# Altium integrated library 860010580021_Altium_WCAP-ATG8_rev20a.IntLib: 195 symbols (part 1 of 2) (continued)
## 860010378023
designator C?, comment 3300uF, 16V
WCAP-ATG8 Aluminum Electrolytic Capacitor, Radial, THT, D13xH20mm, 3300uF, 16V; Manufacturer Part Number: 860010378023; Manufacturer: Wurth Elektronik; Dissipation Factor: 16%; Endurance: 2000h; Leakage Current: 528uA; Ripple Current: 1750mA; Capacitance Tolerance: +/-20%; Rated Voltage: 16VDC; Technical Reference: ATBI200332M016DSPACB000; ComponentLink1Description: Manufacturer; ComponentLink1URL: http://www.we-online.de; ComponentLink2Description: Datasheet; ComponentLink2URL: https://www.we-online.com/catalog/datasheet/860010378023.pdf; Height: 20mm; Mounting Technology: THT; Operating Temperature: -40 to +85degC; Packaging: Ammo Pack; Published Date: May 2020; Capacitance: 3300uF; Diameter: 13mm
footprint WCAP-ATG8_13x20
pins: 1 N, 2 P

## 860010380024
designator C?, comment 3900uF, 16V
WCAP-ATG8 Aluminum Electrolytic Capacitor, Radial, THT, D16xH25mm, 3900uF, 16V; Manufacturer Part Number: 860010380024; Manufacturer: Wurth Elektronik; Dissipation Factor: 16%; Endurance: 2000h; Leakage Current: 624uA; Ripple Current: 2002mA; Capacitance Tolerance: +/-20%; Rated Voltage: 16VDC; Technical Reference: ATBK250392M016DSPAEB000; ComponentLink1Description: Manufacturer; ComponentLink1URL: http://www.we-online.de; ComponentLink2Description: Datasheet; ComponentLink2URL: https://www.we-online.com/catalog/datasheet/860010380024.pdf; Height: 25mm; Mounting Technology: THT; Operating Temperature: -40 to +85degC; Packaging: Ammo Pack; Published Date: May 2020; Capacitance: 3900uF; Diameter: 16mm
footprint WCAP-ATG8_16x25
pins: 1 N, 2 P

## 860010380025
designator C?, comment 4700uF, 16V
WCAP-ATG8 Aluminum Electrolytic Capacitor, Radial, THT, D16xH25mm, 4700uF, 16V; Manufacturer Part Number: 860010380025; Manufacturer: Wurth Elektronik; Dissipation Factor: 16%; Endurance: 2000h; Leakage Current: 752uA; Ripple Current: 2310mA; Capacitance Tolerance: +/-20%; Rated Voltage: 16VDC; Technical Reference: ATBK250472M016DSPAEB000; ComponentLink1Description: Manufacturer; ComponentLink1URL: http://www.we-online.de; ComponentLink2Description: Datasheet; ComponentLink2URL: https://www.we-online.com/catalog/datasheet/860010380025.pdf; Height: 25mm; Mounting Technology: THT; Operating Temperature: -40 to +85degC; Packaging: Ammo Pack; Published Date: May 2020; Capacitance: 4700uF; Diameter: 16mm
footprint WCAP-ATG8_16x25
pins: 1 N, 2 P

## 860010380026
designator C?, comment 5600uF, 16V
WCAP-ATG8 Aluminum Electrolytic Capacitor, Radial, THT, D16xH31.5mm, 5600uF, 16V; Manufacturer Part Number: 860010380026; Manufacturer: Wurth Elektronik; Dissipation Factor: 16%; Endurance: 2000h; Leakage Current: 896uA; Ripple Current: 2453mA; Capacitance Tolerance: +/-20%; Rated Voltage: 16VDC; Technical Reference: ATBK315562M016DSPADB000; ComponentLink1Description: Manufacturer; ComponentLink1URL: http://www.we-online.de; ComponentLink2Description: Datasheet; ComponentLink2URL: https://www.we-online.com/catalog/datasheet/860010380026.pdf; Height: 31.5mm; Mounting Technology: THT; Operating Temperature: -40 to +85degC; Packaging: Ammo Pack; Published Date: May 2020; Capacitance: 5600uF; Diameter: 16mm
footprint WCAP-ATG8_16x31.5
pins: 1 N, 2 P

## 860010380027
designator C?, comment 6800uF, 16V
WCAP-ATG8 Aluminum Electrolytic Capacitor, Radial, THT, D16xH31.5mm, 6800uF, 16V; Manufacturer Part Number: 860010380027; Manufacturer: Wurth Elektronik; Dissipation Factor: 16%; Endurance: 2000h; Leakage Current: 1088uA; Ripple Current: 2805mA; Capacitance Tolerance: +/-20%; Rated Voltage: 16VDC; Technical Reference: ATBK315682M016DSPADB000; ComponentLink1Description: Manufacturer; ComponentLink1URL: http://www.we-online.de; ComponentLink2Description: Datasheet; ComponentLink2URL: https://www.we-online.com/catalog/datasheet/860010380027.pdf; Height: 31.5mm; Mounting Technology: THT; Operating Temperature: -40 to +85degC; Packaging: Ammo Pack; Published Date: May 2020; Capacitance: 6800uF; Diameter: 16mm
footprint WCAP-ATG8_16x31.5
pins: 1 N, 2 P

## 860010380028
designator C?, comment 8200uF, 16V
WCAP-ATG8 Aluminum Electrolytic Capacitor, Radial, THT, D16xH35.5mm, 8200uF, 16V; Manufacturer Part Number: 860010380028; Manufacturer: Wurth Elektronik; Dissipation Factor: 16%; Endurance: 2000h; Leakage Current: 1312uA; Ripple Current: 2893mA; Capacitance Tolerance: +/-20%; Rated Voltage: 16VDC; Technical Reference: ATBK355822M016DSPADB000; ComponentLink1Description: Manufacturer; ComponentLink1URL: http://www.we-online.de; ComponentLink2Description: Datasheet; ComponentLink2URL: https://www.we-online.com/catalog/datasheet/860010380028.pdf; Height: 35.5mm; Mounting Technology: THT; Operating Temperature: -40 to +85degC; Packaging: Ammo Pack; Published Date: May 2020; Capacitance: 8200uF; Diameter: 16mm
footprint WCAP-ATG8_16x35.5
pins: 1 N, 2 P

## 860010381029
designator C?, comment 10000uF, 16V
WCAP-ATG8 Aluminum Electrolytic Capacitor, Radial, THT, D18xH35.5mm, 10000uF, 16V; Manufacturer Part Number: 860010381029; Manufacturer: Wurth Elektronik; Dissipation Factor: 16%; Endurance: 2000h; Leakage Current: 1600uA; Ripple Current: 2970mA; Capacitance Tolerance: +/-20%; Rated Voltage: 16VDC; Technical Reference: ATBL355103M016DSPAEB000; ComponentLink1Description: Manufacturer; ComponentLink1URL: http://www.we-online.de; ComponentLink2Description: Datasheet; ComponentLink2URL: https://www.we-online.com/catalog/datasheet/860010381029.pdf; Height: 35.5mm; Mounting Technology: THT; Operating Temperature: -40 to +85degC; Packaging: Ammo Pack; Published Date: May 2020; Capacitance: 10000uF; Diameter: 18mm
footprint WCAP-ATG8_18x35.5
pins: 1 N, 2 P

## 860010381030
designator C?, comment 12000uF, 16V
WCAP-ATG8 Aluminum Electrolytic Capacitor, Radial, THT, D18xH35.5mm, 12000uF, 16V; Manufacturer Part Number: 860010381030; Manufacturer: Wurth Elektronik; Dissipation Factor: 16%; Endurance: 2000h; Leakage Current: 1920uA; Ripple Current: 3058mA; Capacitance Tolerance: +/-20%; Rated Voltage: 16VDC; Technical Reference: ATBL355123M016DSPAEB000; ComponentLink1Description: Manufacturer; ComponentLink1URL: http://www.we-online.de; ComponentLink2Description: Datasheet; ComponentLink2URL: https://www.we-online.com/catalog/datasheet/860010381030.pdf; Height: 35.5mm; Mounting Technology: THT; Operating Temperature: -40 to +85degC; Packaging: Ammo Pack; Published Date: May 2020; Capacitance: 12000uF; Diameter: 18mm
footprint WCAP-ATG8_18x35.5
pins: 1 N, 2 P

## 860010383031
designator C?, comment 15000uF, 16V
WCAP-ATG8 Aluminum Electrolytic Capacitor, Radial, THT, D22xH41mm, 15000uF, 16V; Manufacturer Part Number: 860010383031; Manufacturer: Wurth Elektronik; Dissipation Factor: 16%; Endurance: 2000h; Leakage Current: 2400uA; Ripple Current: 3905mA; Capacitance Tolerance: +/-20%; Rated Voltage: 16VDC; Technical Reference: ATBN410153M016DSPS2B000; ComponentLink1Description: Manufacturer; ComponentLink1URL: http://www.we-online.de; ComponentLink2Description: Datasheet; ComponentLink2URL: https://www.we-online.com/catalog/datasheet/860010383031.pdf; Height: 41mm; Mounting Technology: THT; Operating Temperature: -40 to +85degC; Packaging: Ammo Pack; Published Date: May 2020; Capacitance: 15000uF; Diameter: 22mm
footprint WCAP-ATG8_22x41
pins: 1 N, 2 P

## 860010472001
designator C?, comment 4.7uF, 25V
WCAP-ATG8 Aluminum Electrolytic Capacitor, Radial, THT, D5xH11mm, 4.7uF, 25V; Manufacturer Part Number: 860010472001; Manufacturer: Wurth Elektronik; Dissipation Factor: 14%; Endurance: 2000h; Leakage Current: 3uA; Ripple Current: 34mA; Capacitance Tolerance: +/-20%; Rated Voltage: 25VDC; Technical Reference: ATBC1104R7M025DSPA3B000; ComponentLink1Description: Manufacturer; ComponentLink1URL: http://www.we-online.de; ComponentLink2Description: Datasheet; ComponentLink2URL: https://www.we-online.com/catalog/datasheet/860010472001.pdf; Height: 11mm; Mounting Technology: THT; Operating Temperature: -40 to +85degC; Packaging: Ammo Pack; Published Date: May 2020; Capacitance: 4.7uF; Diameter: 5mm
footprint WCAP-ATG8_5x11
pins: 1 N, 2 P

## 860010472002
designator C?, comment 10uF, 25V
WCAP-ATG8 Aluminum Electrolytic Capacitor, Radial, THT, D5xH11mm, 10uF, 25V; Manufacturer Part Number: 860010472002; Manufacturer: Wurth Elektronik; Dissipation Factor: 14%; Endurance: 2000h; Leakage Current: 3uA; Ripple Current: 50mA; Capacitance Tolerance: +/-20%; Rated Voltage: 25VDC; Technical Reference: ATBC110100M025DSPA3B000; ComponentLink1Description: Manufacturer; ComponentLink1URL: http://www.we-online.de; ComponentLink2Description: Datasheet; ComponentLink2URL: https://www.we-online.com/catalog/datasheet/860010472002.pdf; Height: 11mm; Mounting Technology: THT; Operating Temperature: -40 to +85degC; Packaging: Ammo Pack; Published Date: May 2020; Capacitance: 10uF; Diameter: 5mm
footprint WCAP-ATG8_5x11
pins: 1 N, 2 P

## 860010472003
designator C?, comment 22uF, 25V
WCAP-ATG8 Aluminum Electrolytic Capacitor, Radial, THT, D5xH11mm, 22uF, 25V; Manufacturer Part Number: 860010472003; Manufacturer: Wurth Elektronik; Dissipation Factor: 14%; Endurance: 2000h; Leakage Current: 5.5uA; Ripple Current: 94mA; Capacitance Tolerance: +/-20%; Rated Voltage: 25VDC; Technical Reference: ATBC110220M025DSPA3B000; ComponentLink1Description: Manufacturer; ComponentLink1URL: http://www.we-online.de; ComponentLink2Description: Datasheet; ComponentLink2URL: https://www.we-online.com/catalog/datasheet/860010472003.pdf; Height: 11mm; Mounting Technology: THT; Operating Temperature: -40 to +85degC; Packaging: Ammo Pack; Published Date: May 2020; Capacitance: 22uF; Diameter: 5mm
footprint WCAP-ATG8_5x11
pins: 1 N, 2 P

## 860010472004
designator C?, comment 33uF, 25V
WCAP-ATG8 Aluminum Electrolytic Capacitor, Radial, THT, D5xH11mm, 33uF, 25V; Manufacturer Part Number: 860010472004; Manufacturer: Wurth Elektronik; Dissipation Factor: 14%; Endurance: 2000h; Leakage Current: 8.25uA; Ripple Current: 105mA; Capacitance Tolerance: +/-20%; Rated Voltage: 25VDC; Technical Reference: ATBC110330M025DSPA3B000; ComponentLink1Description: Manufacturer; ComponentLink1URL: http://www.we-online.de; ComponentLink2Description: Datasheet; ComponentLink2URL: https://www.we-online.com/catalog/datasheet/860010472004.pdf; Height: 11mm; Mounting Technology: THT; Operating Temperature: -40 to +85degC; Packaging: Ammo Pack; Published Date: May 2020; Capacitance: 33uF; Diameter: 5mm
footprint WCAP-ATG8_5x11
pins: 1 N, 2 P

## 860010472005
designator C?, comment 47uF, 25V
WCAP-ATG8 Aluminum Electrolytic Capacitor, Radial, THT, D5xH11mm, 47uF, 25V; Manufacturer Part Number: 860010472005; Manufacturer: Wurth Elektronik; Dissipation Factor: 14%; Endurance: 2000h; Leakage Current: 11.75uA; Ripple Current: 132mA; Capacitance Tolerance: +/-20%; Rated Voltage: 25VDC; Technical Reference: ATBC110470M025DSPA3B000; ComponentLink1Description: Manufacturer; ComponentLink1URL: http://www.we-online.de; ComponentLink2Description: Datasheet; ComponentLink2URL: https://www.we-online.com/catalog/datasheet/860010472005.pdf; Height: 11mm; Mounting Technology: THT; Operating Temperature: -40 to +85degC; Packaging: Ammo Pack; Published Date: May 2020; Capacitance: 47uF; Diameter: 5mm
footprint WCAP-ATG8_5x11
pins: 1 N, 2 P

## 860010473006
designator C?, comment 68uF, 25V
WCAP-ATG8 Aluminum Electrolytic Capacitor, Radial, THT, D6.3xH11mm, 68uF, 25V; Manufacturer Part Number: 860010473006; Manufacturer: Wurth Elektronik; Dissipation Factor: 14%; Endurance: 2000h; Leakage Current: 17uA; Ripple Current: 176mA; Capacitance Tolerance: +/-20%; Rated Voltage: 25VDC; Technical Reference: ATBD110680M025DSPA4B000; ComponentLink1Description: Manufacturer; ComponentLink1URL: http://www.we-online.de; ComponentLink2Description: Datasheet; ComponentLink2URL: https://www.we-online.com/catalog/datasheet/860010473006.pdf; Height: 11mm; Mounting Technology: THT; Operating Temperature: -40 to +85degC; Packaging: Ammo Pack; Published Date: May 2020; Capacitance: 68uF; Diameter: 6.3mm
footprint WCAP-ATG8_6.3x11
pins: 1 N, 2 P

## 860010473007
designator C?, comment 100uF, 25V
WCAP-ATG8 Aluminum Electrolytic Capacitor, Radial, THT, D6.3xH11mm, 100uF, 25V; Manufacturer Part Number: 860010473007; Manufacturer: Wurth Elektronik; Dissipation Factor: 14%; Endurance: 2000h; Leakage Current: 25uA; Ripple Current: 209mA; Capacitance Tolerance: +/-20%; Rated Voltage: 25VDC; Technical Reference: ATBD110101M025DSPA4B000; ComponentLink1Description: Manufacturer; ComponentLink1URL: http://www.we-online.de; ComponentLink2Description: Datasheet; ComponentLink2URL: https://www.we-online.com/catalog/datasheet/860010473007.pdf; Height: 11mm; Mounting Technology: THT; Operating Temperature: -40 to +85degC; Packaging: Ammo Pack; Published Date: May 2020; Capacitance: 100uF; Diameter: 6.3mm
footprint WCAP-ATG8_6.3x11
pins: 1 N, 2 P

## 860010473008
designator C?, comment 120uF, 25V
WCAP-ATG8 Aluminum Electrolytic Capacitor, Radial, THT, D6.3xH11mm, 120uF, 25V; Manufacturer Part Number: 860010473008; Manufacturer: Wurth Elektronik; Dissipation Factor: 14%; Endurance: 2000h; Leakage Current: 30uA; Ripple Current: 253mA; Capacitance Tolerance: +/-20%; Rated Voltage: 25VDC; Technical Reference: ATBD110121M025DSPA4B000; ComponentLink1Description: Manufacturer; ComponentLink1URL: http://www.we-online.de; ComponentLink2Description: Datasheet; ComponentLink2URL: https://www.we-online.com/catalog/datasheet/860010473008.pdf; Height: 11mm; Mounting Technology: THT; Operating Temperature: -40 to +85degC; Packaging: Ammo Pack; Published Date: May 2020; Capacitance: 120uF; Diameter: 6.3mm
footprint WCAP-ATG8_6.3x11
pins: 1 N, 2 P

## 860010473009
designator C?, comment 150uF, 25V
WCAP-ATG8 Aluminum Electrolytic Capacitor, Radial, THT, D6.3xH11mm, 150uF, 25V; Manufacturer Part Number: 860010473009; Manufacturer: Wurth Elektronik; Dissipation Factor: 14%; Endurance: 2000h; Leakage Current: 37.5uA; Ripple Current: 275mA; Capacitance Tolerance: +/-20%; Rated Voltage: 25VDC; Technical Reference: ATBD110151M025DSPA4B000; ComponentLink1Description: Manufacturer; ComponentLink1URL: http://www.we-online.de; ComponentLink2Description: Datasheet; ComponentLink2URL: https://www.we-online.com/catalog/datasheet/860010473009.pdf; Height: 11mm; Mounting Technology: THT; Operating Temperature: -40 to +85degC; Packaging: Ammo Pack; Published Date: May 2020; Capacitance: 150uF; Diameter: 6.3mm
footprint WCAP-ATG8_6.3x11
pins: 1 N, 2 P

## 860010473010
designator C?, comment 180uF, 25V
WCAP-ATG8 Aluminum Electrolytic Capacitor, Radial, THT, D6.3xH11mm, 180uF, 25V; Manufacturer Part Number: 860010473010; Manufacturer: Wurth Elektronik; Dissipation Factor: 14%; Endurance: 2000h; Leakage Current: 45uA; Ripple Current: 280mA; Capacitance Tolerance: +/-20%; Rated Voltage: 25VDC; Technical Reference: ATBD110181M025DSPA4B000; ComponentLink1Description: Manufacturer; ComponentLink1URL: http://www.we-online.de; ComponentLink2Description: Datasheet; ComponentLink2URL: https://www.we-online.com/catalog/datasheet/860010473010.pdf; Height: 11mm; Mounting Technology: THT; Operating Temperature: -40 to +85degC; Packaging: Ammo Pack; Published Date: May 2020; Capacitance: 180uF; Diameter: 6.3mm
footprint WCAP-ATG8_6.3x11
pins: 1 N, 2 P

## 860010473011
designator C?, comment 220uF, 25V
WCAP-ATG8 Aluminum Electrolytic Capacitor, Radial, THT, D6.3xH11mm, 220uF, 25V; Manufacturer Part Number: 860010473011; Manufacturer: Wurth Elektronik; Dissipation Factor: 14%; Endurance: 2000h; Leakage Current: 55uA; Ripple Current: 310mA; Capacitance Tolerance: +/-20%; Rated Voltage: 25VDC; Technical Reference: ATBD110221M025DSPA4B000; ComponentLink1Description: Manufacturer; ComponentLink1URL: http://www.we-online.de; ComponentLink2Description: Datasheet; ComponentLink2URL: https://www.we-online.com/catalog/datasheet/860010473011.pdf; Height: 11mm; Mounting Technology: THT; Operating Temperature: -40 to +85degC; Packaging: Ammo Pack; Published Date: May 2020; Capacitance: 220uF; Diameter: 6.3mm
footprint WCAP-ATG8_6.3x11
pins: 1 N, 2 P

## 860010474012
designator C?, comment 330uF, 25V
WCAP-ATG8 Aluminum Electrolytic Capacitor, Radial, THT, D8xH11.5mm, 330uF, 25V; Manufacturer Part Number: 860010474012; Manufacturer: Wurth Elektronik; Dissipation Factor: 14%; Endurance: 2000h; Leakage Current: 82.5uA; Ripple Current: 451mA; Capacitance Tolerance: +/-20%; Rated Voltage: 25VDC; Technical Reference: ATBE115331M025DSPA7B000; ComponentLink1Description: Manufacturer; ComponentLink1URL: http://www.we-online.de; ComponentLink2Description: Datasheet; ComponentLink2URL: https://www.we-online.com/catalog/datasheet/860010474012.pdf; Height: 11.5mm; Mounting Technology: THT; Operating Temperature: -40 to +85degC; Packaging: Ammo Pack; Published Date: May 2020; Capacitance: 330uF; Diameter: 8mm
footprint WCAP-ATG8_8x11.5
pins: 1 N, 2 P

## 860010474013
designator C?, comment 470uF, 25V
WCAP-ATG8 Aluminum Electrolytic Capacitor, Radial, THT, D8xH11.5mm, 470uF, 25V; Manufacturer Part Number: 860010474013; Manufacturer: Wurth Elektronik; Dissipation Factor: 14%; Endurance: 2000h; Leakage Current: 117.5uA; Ripple Current: 561mA; Capacitance Tolerance: +/-20%; Rated Voltage: 25VDC; Technical Reference: ATBE115471M025DSPA7B000; ComponentLink1Description: Manufacturer; ComponentLink1URL: http://www.we-online.de; ComponentLink2Description: Datasheet; ComponentLink2URL: https://www.we-online.com/catalog/datasheet/860010474013.pdf; Height: 11.5mm; Mounting Technology: THT; Operating Temperature: -40 to +85degC; Packaging: Ammo Pack; Published Date: May 2020; Capacitance: 470uF; Diameter: 8mm
footprint WCAP-ATG8_8x11.5
pins: 1 N, 2 P

## 860010475014
designator C?, comment 560uF, 25V
WCAP-ATG8 Aluminum Electrolytic Capacitor, Radial, THT, D10xH16mm, 560uF, 25V; Manufacturer Part Number: 860010475014; Manufacturer: Wurth Elektronik; Dissipation Factor: 14%; Endurance: 2000h; Leakage Current: 140uA; Ripple Current: 693mA; Capacitance Tolerance: +/-20%; Rated Voltage: 25VDC; Technical Reference: ATBF160561M025DSPAAB000; ComponentLink1Description: Manufacturer; ComponentLink1URL: http://www.we-online.de; ComponentLink2Description: Datasheet; ComponentLink2URL: https://www.we-online.com/catalog/datasheet/860010475014.pdf; Height: 16mm; Mounting Technology: THT; Operating Temperature: -40 to +85degC; Packaging: Ammo Pack; Published Date: May 2020; Capacitance: 560uF; Diameter: 10mm
footprint WCAP-ATG8_10x16
pins: 1 N, 2 P

## 860010475015
designator C?, comment 680uF, 25V
WCAP-ATG8 Aluminum Electrolytic Capacitor, Radial, THT, D10xH16mm, 680uF, 25V; Manufacturer Part Number: 860010475015; Manufacturer: Wurth Elektronik; Dissipation Factor: 14%; Endurance: 2000h; Leakage Current: 170uA; Ripple Current: 792mA; Capacitance Tolerance: +/-20%; Rated Voltage: 25VDC; Technical Reference: ATBF160681M025DSPAAB000; ComponentLink1Description: Manufacturer; ComponentLink1URL: http://www.we-online.de; ComponentLink2Description: Datasheet; ComponentLink2URL: https://www.we-online.com/catalog/datasheet/860010475015.pdf; Height: 16mm; Mounting Technology: THT; Operating Temperature: -40 to +85degC; Packaging: Ammo Pack; Published Date: May 2020; Capacitance: 680uF; Diameter: 10mm
footprint WCAP-ATG8_10x16
pins: 1 N, 2 P

## 860010475016
designator C?, comment 820uF, 25V
WCAP-ATG8 Aluminum Electrolytic Capacitor, Radial, THT, D10xH20mm, 820uF, 25V; Manufacturer Part Number: 860010475016; Manufacturer: Wurth Elektronik; Dissipation Factor: 14%; Endurance: 2000h; Leakage Current: 205uA; Ripple Current: 891mA; Capacitance Tolerance: +/-20%; Rated Voltage: 25VDC; Technical Reference: ATBF200821M025DSPAAB000; ComponentLink1Description: Manufacturer; ComponentLink1URL: http://www.we-online.de; ComponentLink2Description: Datasheet; ComponentLink2URL: https://www.we-online.com/catalog/datasheet/860010475016.pdf; Height: 20mm; Mounting Technology: THT; Operating Temperature: -40 to +85degC; Packaging: Ammo Pack; Published Date: May 2020; Capacitance: 820uF; Diameter: 10mm
footprint WCAP-ATG8_10x20
pins: 1 N, 2 P

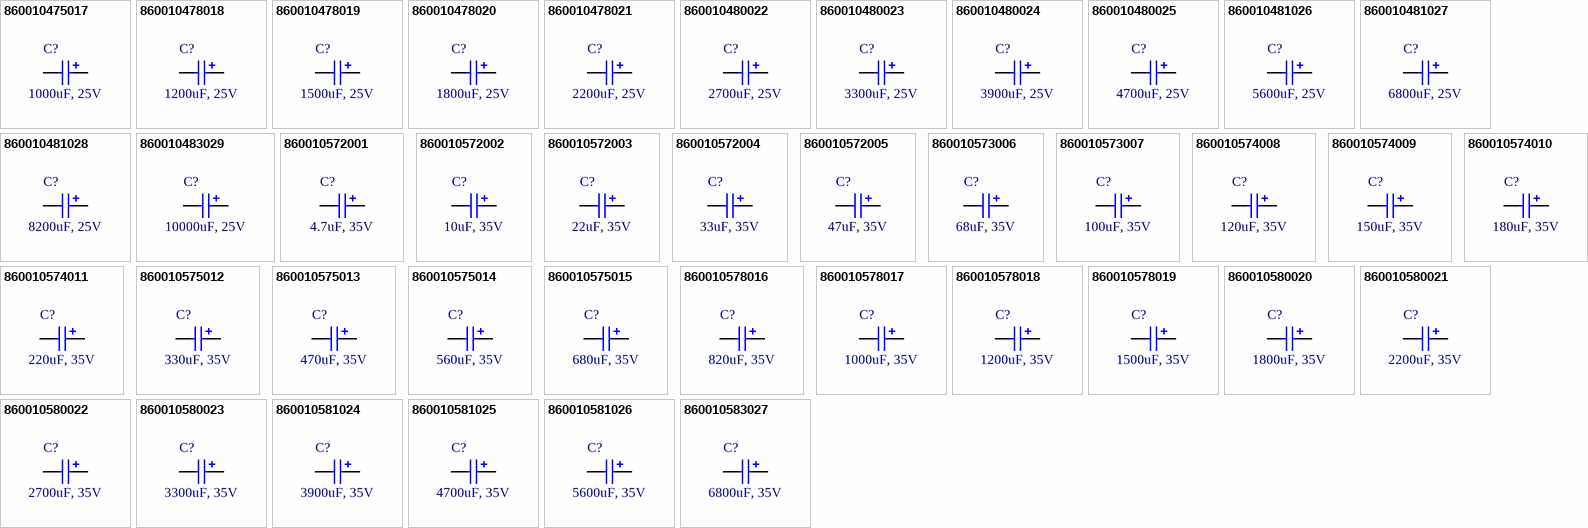
[diagram p2: symbols 860010475017 to 860010583027]

## 860010475017
designator C?, comment 1000uF, 25V
WCAP-ATG8 Aluminum Electrolytic Capacitor, Radial, THT, D10xH20mm, 1000uF, 25V; Manufacturer Part Number: 860010475017; Manufacturer: Wurth Elektronik; Dissipation Factor: 14%; Endurance: 2000h; Leakage Current: 250uA; Ripple Current: 1050mA; Capacitance Tolerance: +/-20%; Rated Voltage: 25VDC; Technical Reference: ATBF200102M025DSPAAB000; ComponentLink1Description: Manufacturer; ComponentLink1URL: http://www.we-online.de; ComponentLink2Description: Datasheet; ComponentLink2URL: https://www.we-online.com/catalog/datasheet/860010475017.pdf; Height: 20mm; Mounting Technology: THT; Operating Temperature: -40 to +85degC; Packaging: Ammo Pack; Published Date: May 2020; Capacitance: 1000uF; Diameter: 10mm
footprint WCAP-ATG8_10x20
pins: 1 N, 2 P

## 860010478018
designator C?, comment 1200uF, 25V
WCAP-ATG8 Aluminum Electrolytic Capacitor, Radial, THT, D13xH20mm, 1200uF, 25V; Manufacturer Part Number: 860010478018; Manufacturer: Wurth Elektronik; Dissipation Factor: 14%; Endurance: 2000h; Leakage Current: 300uA; Ripple Current: 1155mA; Capacitance Tolerance: +/-20%; Rated Voltage: 25VDC; Technical Reference: ATBI200122M025DSPACB000; ComponentLink1Description: Manufacturer; ComponentLink1URL: http://www.we-online.de; ComponentLink2Description: Datasheet; ComponentLink2URL: https://www.we-online.com/catalog/datasheet/860010478018.pdf; Height: 20mm; Mounting Technology: THT; Operating Temperature: -40 to +85degC; Packaging: Ammo Pack; Published Date: May 2020; Capacitance: 1200uF; Diameter: 13mm
footprint WCAP-ATG8_13x20
pins: 1 N, 2 P

## 860010478019
designator C?, comment 1500uF, 25V
WCAP-ATG8 Aluminum Electrolytic Capacitor, Radial, THT, D13xH20mm, 1500uF, 25V; Manufacturer Part Number: 860010478019; Manufacturer: Wurth Elektronik; Dissipation Factor: 14%; Endurance: 2000h; Leakage Current: 375uA; Ripple Current: 1353mA; Capacitance Tolerance: +/-20%; Rated Voltage: 25VDC; Technical Reference: ATBI200152M025DSPACB000; ComponentLink1Description: Manufacturer; ComponentLink1URL: http://www.we-online.de; ComponentLink2Description: Datasheet; ComponentLink2URL: https://www.we-online.com/catalog/datasheet/860010478019.pdf; Height: 20mm; Mounting Technology: THT; Operating Temperature: -40 to +85degC; Packaging: Ammo Pack; Published Date: May 2020; Capacitance: 1500uF; Diameter: 13mm
footprint WCAP-ATG8_13x20
pins: 1 N, 2 P

## 860010478020
designator C?, comment 1800uF, 25V
WCAP-ATG8 Aluminum Electrolytic Capacitor, Radial, THT, D13xH20mm, 1800uF, 25V; Manufacturer Part Number: 860010478020; Manufacturer: Wurth Elektronik; Dissipation Factor: 14%; Endurance: 2000h; Leakage Current: 450uA; Ripple Current: 1496mA; Capacitance Tolerance: +/-20%; Rated Voltage: 25VDC; Technical Reference: ATBI200182M025DSPACB000; ComponentLink1Description: Manufacturer; ComponentLink1URL: http://www.we-online.de; ComponentLink2Description: Datasheet; ComponentLink2URL: https://www.we-online.com/catalog/datasheet/860010478020.pdf; Height: 20mm; Mounting Technology: THT; Operating Temperature: -40 to +85degC; Packaging: Ammo Pack; Published Date: May 2020; Capacitance: 1800uF; Diameter: 13mm
footprint WCAP-ATG8_13x20
pins: 1 N, 2 P

## 860010478021
designator C?, comment 2200uF, 25V
WCAP-ATG8 Aluminum Electrolytic Capacitor, Radial, THT, D13xH25mm, 2200uF, 25V; Manufacturer Part Number: 860010478021; Manufacturer: Wurth Elektronik; Dissipation Factor: 14%; Endurance: 2000h; Leakage Current: 550uA; Ripple Current: 1705mA; Capacitance Tolerance: +/-20%; Rated Voltage: 25VDC; Technical Reference: ATBI250222M025DSPACB000; ComponentLink1Description: Manufacturer; ComponentLink1URL: http://www.we-online.de; ComponentLink2Description: Datasheet; ComponentLink2URL: https://www.we-online.com/catalog/datasheet/860010478021.pdf; Height: 25mm; Mounting Technology: THT; Operating Temperature: -40 to +85degC; Packaging: Ammo Pack; Published Date: May 2020; Capacitance: 2200uF; Diameter: 13mm
footprint WCAP-ATG8_13x25
pins: 1 N, 2 P

## 860010480022
designator C?, comment 2700uF, 25V
WCAP-ATG8 Aluminum Electrolytic Capacitor, Radial, THT, D16xH25mm, 2700uF, 25V; Manufacturer Part Number: 860010480022; Manufacturer: Wurth Elektronik; Dissipation Factor: 14%; Endurance: 2000h; Leakage Current: 675uA; Ripple Current: 1804mA; Capacitance Tolerance: +/-20%; Rated Voltage: 25VDC; Technical Reference: ATBK250272M025DSPAEB000; ComponentLink1Description: Manufacturer; ComponentLink1URL: http://www.we-online.de; ComponentLink2Description: Datasheet; ComponentLink2URL: https://www.we-online.com/catalog/datasheet/860010480022.pdf; Height: 25mm; Mounting Technology: THT; Operating Temperature: -40 to +85degC; Packaging: Ammo Pack; Published Date: May 2020; Capacitance: 2700uF; Diameter: 16mm
footprint WCAP-ATG8_16x25
pins: 1 N, 2 P

## 860010480023
designator C?, comment 3300uF, 25V
WCAP-ATG8 Aluminum Electrolytic Capacitor, Radial, THT, D16xH25mm, 3300uF, 25V; Manufacturer Part Number: 860010480023; Manufacturer: Wurth Elektronik; Dissipation Factor: 14%; Endurance: 2000h; Leakage Current: 825uA; Ripple Current: 1870mA; Capacitance Tolerance: +/-20%; Rated Voltage: 25VDC; Technical Reference: ATBK250332M025DSPAEB000; ComponentLink1Description: Manufacturer; ComponentLink1URL: http://www.we-online.de; ComponentLink2Description: Datasheet; ComponentLink2URL: https://www.we-online.com/catalog/datasheet/860010480023.pdf; Height: 25mm; Mounting Technology: THT; Operating Temperature: -40 to +85degC; Packaging: Ammo Pack; Published Date: May 2020; Capacitance: 3300uF; Diameter: 16mm
footprint WCAP-ATG8_16x25
pins: 1 N, 2 P

## 860010480024
designator C?, comment 3900uF, 25V
WCAP-ATG8 Aluminum Electrolytic Capacitor, Radial, THT, D16xH31.5mm, 3900uF, 25V; Manufacturer Part Number: 860010480024; Manufacturer: Wurth Elektronik; Dissipation Factor: 14%; Endurance: 2000h; Leakage Current: 975uA; Ripple Current: 2343mA; Capacitance Tolerance: +/-20%; Rated Voltage: 25VDC; Technical Reference: ATBK315392M025DSPADB000; ComponentLink1Description: Manufacturer; ComponentLink1URL: http://www.we-online.de; ComponentLink2Description: Datasheet; ComponentLink2URL: https://www.we-online.com/catalog/datasheet/860010480024.pdf; Height: 31.5mm; Mounting Technology: THT; Operating Temperature: -40 to +85degC; Packaging: Ammo Pack; Published Date: May 2020; Capacitance: 3900uF; Diameter: 16mm
footprint WCAP-ATG8_16x31.5
pins: 1 N, 2 P

## 860010480025
designator C?, comment 4700uF, 25V
WCAP-ATG8 Aluminum Electrolytic Capacitor, Radial, THT, D16xH31.5mm, 4700uF, 25V; Manufacturer Part Number: 860010480025; Manufacturer: Wurth Elektronik; Dissipation Factor: 14%; Endurance: 2000h; Leakage Current: 1175uA; Ripple Current: 2640mA; Capacitance Tolerance: +/-20%; Rated Voltage: 25VDC; Technical Reference: ATBK315472M025DSPADB000; ComponentLink1Description: Manufacturer; ComponentLink1URL: http://www.we-online.de; ComponentLink2Description: Datasheet; ComponentLink2URL: https://www.we-online.com/catalog/datasheet/860010480025.pdf; Height: 31.5mm; Mounting Technology: THT; Operating Temperature: -40 to +85degC; Packaging: Ammo Pack; Published Date: May 2020; Capacitance: 4700uF; Diameter: 16mm
footprint WCAP-ATG8_16x31.5
pins: 1 N, 2 P

## 860010481026
designator C?, comment 5600uF, 25V
WCAP-ATG8 Aluminum Electrolytic Capacitor, Radial, THT, D18xH31.5mm, 5600uF, 25V; Manufacturer Part Number: 860010481026; Manufacturer: Wurth Elektronik; Dissipation Factor: 14%; Endurance: 2000h; Leakage Current: 1400uA; Ripple Current: 2816mA; Capacitance Tolerance: +/-20%; Rated Voltage: 25VDC; Technical Reference: ATBL315562M025DSPAEB000; ComponentLink1Description: Manufacturer; ComponentLink1URL: http://www.we-online.de; ComponentLink2Description: Datasheet; ComponentLink2URL: https://www.we-online.com/catalog/datasheet/860010481026.pdf; Height: 31.5mm; Mounting Technology: THT; Operating Temperature: -40 to +85degC; Packaging: Ammo Pack; Published Date: May 2020; Capacitance: 5600uF; Diameter: 18mm
footprint WCAP-ATG8_18x31.5
pins: 1 N, 2 P

## 860010481027
designator C?, comment 6800uF, 25V
WCAP-ATG8 Aluminum Electrolytic Capacitor, Radial, THT, D18xH35.5mm, 6800uF, 25V; Manufacturer Part Number: 860010481027; Manufacturer: Wurth Elektronik; Dissipation Factor: 14%; Endurance: 2000h; Leakage Current: 1700uA; Ripple Current: 2970mA; Capacitance Tolerance: +/-20%; Rated Voltage: 25VDC; Technical Reference: ATBL355682M025DSPAEB000; ComponentLink1Description: Manufacturer; ComponentLink1URL: http://www.we-online.de; ComponentLink2Description: Datasheet; ComponentLink2URL: https://www.we-online.com/catalog/datasheet/860010481027.pdf; Height: 35.5mm; Mounting Technology: THT; Operating Temperature: -40 to +85degC; Packaging: Ammo Pack; Published Date: May 2020; Capacitance: 6800uF; Diameter: 18mm
footprint WCAP-ATG8_18x35.5
pins: 1 N, 2 P

## 860010481028
designator C?, comment 8200uF, 25V
WCAP-ATG8 Aluminum Electrolytic Capacitor, Radial, THT, D18xH35.5mm, 8200uF, 25V; Manufacturer Part Number: 860010481028; Manufacturer: Wurth Elektronik; Dissipation Factor: 14%; Endurance: 2000h; Leakage Current: 2050uA; Ripple Current: 2981mA; Capacitance Tolerance: +/-20%; Rated Voltage: 25VDC; Technical Reference: ATBL355822M025DSPAEB000; ComponentLink1Description: Manufacturer; ComponentLink1URL: http://www.we-online.de; ComponentLink2Description: Datasheet; ComponentLink2URL: https://www.we-online.com/catalog/datasheet/860010481028.pdf; Height: 35.5mm; Mounting Technology: THT; Operating Temperature: -40 to +85degC; Packaging: Ammo Pack; Published Date: May 2020; Capacitance: 8200uF; Diameter: 18mm
footprint WCAP-ATG8_18x35.5
pins: 1 N, 2 P

## 860010483029
designator C?, comment 10000uF, 25V
WCAP-ATG8 Aluminum Electrolytic Capacitor, Radial, THT, D22xH41mm, 10000uF, 25V; Manufacturer Part Number: 860010483029; Manufacturer: Wurth Elektronik; Dissipation Factor: 14%; Endurance: 2000h; Leakage Current: 2500uA; Ripple Current: 3960mA; Capacitance Tolerance: +/-20%; Rated Voltage: 25VDC; Technical Reference: ATBN410103M025DSPS2B000; ComponentLink1Description: Manufacturer; ComponentLink1URL: http://www.we-online.de; ComponentLink2Description: Datasheet; ComponentLink2URL: https://www.we-online.com/catalog/datasheet/860010483029.pdf; Height: 41mm; Mounting Technology: THT; Operating Temperature: -40 to +85degC; Packaging: Ammo Pack; Published Date: May 2020; Capacitance: 10000uF; Diameter: 22mm
footprint WCAP-ATG8_22x41
pins: 1 N, 2 P

## 860010572001
designator C?, comment 4.7uF, 35V
WCAP-ATG8 Aluminum Electrolytic Capacitor, Radial, THT, D5xH11mm, 4.7uF, 35V; Manufacturer Part Number: 860010572001; Manufacturer: Wurth Elektronik; Dissipation Factor: 12%; Endurance: 2000h; Leakage Current: 3uA; Ripple Current: 44mA; Capacitance Tolerance: +/-20%; Rated Voltage: 35VDC; Technical Reference: ATBC1104R7M035DSPA3B000; ComponentLink1Description: Manufacturer; ComponentLink1URL: http://www.we-online.de; ComponentLink2Description: Datasheet; ComponentLink2URL: https://www.we-online.com/catalog/datasheet/860010572001.pdf; Height: 11mm; Mounting Technology: THT; Operating Temperature: -40 to +85degC; Packaging: Ammo Pack; Published Date: May 2020; Capacitance: 4.7uF; Diameter: 5mm
footprint WCAP-ATG8_5x11
pins: 1 N, 2 P

## 860010572002
designator C?, comment 10uF, 35V
WCAP-ATG8 Aluminum Electrolytic Capacitor, Radial, THT, D5xH11mm, 10uF, 35V; Manufacturer Part Number: 860010572002; Manufacturer: Wurth Elektronik; Dissipation Factor: 12%; Endurance: 2000h; Leakage Current: 3.5uA; Ripple Current: 66mA; Capacitance Tolerance: +/-20%; Rated Voltage: 35VDC; Technical Reference: ATBC110100M035DSPA3B000; ComponentLink1Description: Manufacturer; ComponentLink1URL: http://www.we-online.de; ComponentLink2Description: Datasheet; ComponentLink2URL: https://www.we-online.com/catalog/datasheet/860010572002.pdf; Height: 11mm; Mounting Technology: THT; Operating Temperature: -40 to +85degC; Packaging: Ammo Pack; Published Date: May 2020; Capacitance: 10uF; Diameter: 5mm
footprint WCAP-ATG8_5x11
pins: 1 N, 2 P

## 860010572003
designator C?, comment 22uF, 35V
WCAP-ATG8 Aluminum Electrolytic Capacitor, Radial, THT, D5xH11mm, 22uF, 35V; Manufacturer Part Number: 860010572003; Manufacturer: Wurth Elektronik; Dissipation Factor: 12%; Endurance: 2000h; Leakage Current: 7.7uA; Ripple Current: 108mA; Capacitance Tolerance: +/-20%; Rated Voltage: 35VDC; Technical Reference: ATBC110220M035DSPA3B000; ComponentLink1Description: Manufacturer; ComponentLink1URL: http://www.we-online.de; ComponentLink2Description: Datasheet; ComponentLink2URL: https://www.we-online.com/catalog/datasheet/860010572003.pdf; Height: 11mm; Mounting Technology: THT; Operating Temperature: -40 to +85degC; Packaging: Ammo Pack; Published Date: May 2020; Capacitance: 22uF; Diameter: 5mm
footprint WCAP-ATG8_5x11
pins: 1 N, 2 P

## 860010572004
designator C?, comment 33uF, 35V
WCAP-ATG8 Aluminum Electrolytic Capacitor, Radial, THT, D5xH11mm, 33uF, 35V; Manufacturer Part Number: 860010572004; Manufacturer: Wurth Elektronik; Dissipation Factor: 12%; Endurance: 2000h; Leakage Current: 11.55uA; Ripple Current: 121mA; Capacitance Tolerance: +/-20%; Rated Voltage: 35VDC; Technical Reference: ATBC110330M035DSPA3B000; ComponentLink1Description: Manufacturer; ComponentLink1URL: http://www.we-online.de; ComponentLink2Description: Datasheet; ComponentLink2URL: https://www.we-online.com/catalog/datasheet/860010572004.pdf; Height: 11mm; Mounting Technology: THT; Operating Temperature: -40 to +85degC; Packaging: Ammo Pack; Published Date: May 2020; Capacitance: 33uF; Diameter: 5mm
footprint WCAP-ATG8_5x11
pins: 1 N, 2 P

## 860010572005
designator C?, comment 47uF, 35V
WCAP-ATG8 Aluminum Electrolytic Capacitor, Radial, THT, D5xH11mm, 47uF, 35V; Manufacturer Part Number: 860010572005; Manufacturer: Wurth Elektronik; Dissipation Factor: 12%; Endurance: 2000h; Leakage Current: 16.45uA; Ripple Current: 143mA; Capacitance Tolerance: +/-20%; Rated Voltage: 35VDC; Technical Reference: ATBC110470M035DSPA3B000; ComponentLink1Description: Manufacturer; ComponentLink1URL: http://www.we-online.de; ComponentLink2Description: Datasheet; ComponentLink2URL: https://www.we-online.com/catalog/datasheet/860010572005.pdf; Height: 11mm; Mounting Technology: THT; Operating Temperature: -40 to +85degC; Packaging: Ammo Pack; Published Date: May 2020; Capacitance: 47uF; Diameter: 5mm
footprint WCAP-ATG8_5x11
pins: 1 N, 2 P

## 860010573006
designator C?, comment 68uF, 35V
WCAP-ATG8 Aluminum Electrolytic Capacitor, Radial, THT, D6.3xH11mm, 68uF, 35V; Manufacturer Part Number: 860010573006; Manufacturer: Wurth Elektronik; Dissipation Factor: 12%; Endurance: 2000h; Leakage Current: 23.8uA; Ripple Current: 198mA; Capacitance Tolerance: +/-20%; Rated Voltage: 35VDC; Technical Reference: ATBD110680M035DSPA4B000; ComponentLink1Description: Manufacturer; ComponentLink1URL: http://www.we-online.de; ComponentLink2Description: Datasheet; ComponentLink2URL: https://www.we-online.com/catalog/datasheet/860010573006.pdf; Height: 11mm; Mounting Technology: THT; Operating Temperature: -40 to +85degC; Packaging: Ammo Pack; Published Date: May 2020; Capacitance: 68uF; Diameter: 6.3mm
footprint WCAP-ATG8_6.3x11
pins: 1 N, 2 P

## 860010573007
designator C?, comment 100uF, 35V
WCAP-ATG8 Aluminum Electrolytic Capacitor, Radial, THT, D6.3xH11mm, 100uF, 35V; Manufacturer Part Number: 860010573007; Manufacturer: Wurth Elektronik; Dissipation Factor: 12%; Endurance: 2000h; Leakage Current: 35uA; Ripple Current: 231mA; Capacitance Tolerance: +/-20%; Rated Voltage: 35VDC; Technical Reference: ATBD110101M035DSPA4B000; ComponentLink1Description: Manufacturer; ComponentLink1URL: http://www.we-online.de; ComponentLink2Description: Datasheet; ComponentLink2URL: https://www.we-online.com/catalog/datasheet/860010573007.pdf; Height: 11mm; Mounting Technology: THT; Operating Temperature: -40 to +85degC; Packaging: Ammo Pack; Published Date: May 2020; Capacitance: 100uF; Diameter: 6.3mm
footprint WCAP-ATG8_6.3x11
pins: 1 N, 2 P

## 860010574008
designator C?, comment 120uF, 35V
WCAP-ATG8 Aluminum Electrolytic Capacitor, Radial, THT, D8xH11.5mm, 120uF, 35V; Manufacturer Part Number: 860010574008; Manufacturer: Wurth Elektronik; Dissipation Factor: 12%; Endurance: 2000h; Leakage Current: 42uA; Ripple Current: 275mA; Capacitance Tolerance: +/-20%; Rated Voltage: 35VDC; Technical Reference: ATBE115121M035DSPA7B000; ComponentLink1Description: Manufacturer; ComponentLink1URL: http://www.we-online.de; ComponentLink2Description: Datasheet; ComponentLink2URL: https://www.we-online.com/catalog/datasheet/860010574008.pdf; Height: 11.5mm; Mounting Technology: THT; Operating Temperature: -40 to +85degC; Packaging: Ammo Pack; Published Date: May 2020; Capacitance: 120uF; Diameter: 8mm
footprint WCAP-ATG8_8x11.5
pins: 1 N, 2 P

## 860010574009
designator C?, comment 150uF, 35V
WCAP-ATG8 Aluminum Electrolytic Capacitor, Radial, THT, D8xH11.5mm, 150uF, 35V; Manufacturer Part Number: 860010574009; Manufacturer: Wurth Elektronik; Dissipation Factor: 12%; Endurance: 2000h; Leakage Current: 52.5uA; Ripple Current: 308mA; Capacitance Tolerance: +/-20%; Rated Voltage: 35VDC; Technical Reference: ATBE115151M035DSPA7B000; ComponentLink1Description: Manufacturer; ComponentLink1URL: http://www.we-online.de; ComponentLink2Description: Datasheet; ComponentLink2URL: https://www.we-online.com/catalog/datasheet/860010574009.pdf; Height: 11.5mm; Mounting Technology: THT; Operating Temperature: -40 to +85degC; Packaging: Ammo Pack; Published Date: May 2020; Capacitance: 150uF; Diameter: 8mm
footprint WCAP-ATG8_8x11.5
pins: 1 N, 2 P

## 860010574010
designator C?, comment 180uF, 35V
WCAP-ATG8 Aluminum Electrolytic Capacitor, Radial, THT, D8xH11.5mm, 180uF, 35V; Manufacturer Part Number: 860010574010; Manufacturer: Wurth Elektronik; Dissipation Factor: 12%; Endurance: 2000h; Leakage Current: 63uA; Ripple Current: 352mA; Capacitance Tolerance: +/-20%; Rated Voltage: 35VDC; Technical Reference: ATBE115181M035DSPA7B000; ComponentLink1Description: Manufacturer; ComponentLink1URL: http://www.we-online.de; ComponentLink2Description: Datasheet; ComponentLink2URL: https://www.we-online.com/catalog/datasheet/860010574010.pdf; Height: 11.5mm; Mounting Technology: THT; Operating Temperature: -40 to +85degC; Packaging: Ammo Pack; Published Date: May 2020; Capacitance: 180uF; Diameter: 8mm
footprint WCAP-ATG8_8x11.5
pins: 1 N, 2 P

## 860010574011
designator C?, comment 220uF, 35V
WCAP-ATG8 Aluminum Electrolytic Capacitor, Radial, THT, D8xH11.5mm, 220uF, 35V; Manufacturer Part Number: 860010574011; Manufacturer: Wurth Elektronik; Dissipation Factor: 12%; Endurance: 2000h; Leakage Current: 77uA; Ripple Current: 385mA; Capacitance Tolerance: +/-20%; Rated Voltage: 35VDC; Technical Reference: ATBE115221M035DSPA7B000; ComponentLink1Description: Manufacturer; ComponentLink1URL: http://www.we-online.de; ComponentLink2Description: Datasheet; ComponentLink2URL: https://www.we-online.com/catalog/datasheet/860010574011.pdf; Height: 11.5mm; Mounting Technology: THT; Operating Temperature: -40 to +85degC; Packaging: Ammo Pack; Published Date: May 2020; Capacitance: 220uF; Diameter: 8mm
footprint WCAP-ATG8_8x11.5
pins: 1 N, 2 P

## 860010575012
designator C?, comment 330uF, 35V
WCAP-ATG8 Aluminum Electrolytic Capacitor, Radial, THT, D10xH12.5mm, 330uF, 35V; Manufacturer Part Number: 860010575012; Manufacturer: Wurth Elektronik; Dissipation Factor: 12%; Endurance: 2000h; Leakage Current: 115.5uA; Ripple Current: 528mA; Capacitance Tolerance: +/-20%; Rated Voltage: 35VDC; Technical Reference: ATBF125331M035DSPA9B000; ComponentLink1Description: Manufacturer; ComponentLink1URL: http://www.we-online.de; ComponentLink2Description: Datasheet; ComponentLink2URL: https://www.we-online.com/catalog/datasheet/860010575012.pdf; Height: 12.5mm; Mounting Technology: THT; Operating Temperature: -40 to +85degC; Packaging: Ammo Pack; Published Date: May 2020; Capacitance: 330uF; Diameter: 10mm
footprint WCAP-ATG8_10x12.5
pins: 1 N, 2 P

## 860010575013
designator C?, comment 470uF, 35V
WCAP-ATG8 Aluminum Electrolytic Capacitor, Radial, THT, D10xH16mm, 470uF, 35V; Manufacturer Part Number: 860010575013; Manufacturer: Wurth Elektronik; Dissipation Factor: 12%; Endurance: 2000h; Leakage Current: 164.5uA; Ripple Current: 693mA; Capacitance Tolerance: +/-20%; Rated Voltage: 35VDC; Technical Reference: ATBF160471M035DSPAAB000; ComponentLink1Description: Manufacturer; ComponentLink1URL: http://www.we-online.de; ComponentLink2Description: Datasheet; ComponentLink2URL: https://www.we-online.com/catalog/datasheet/860010575013.pdf; Height: 16mm; Mounting Technology: THT; Operating Temperature: -40 to +85degC; Packaging: Ammo Pack; Published Date: May 2020; Capacitance: 470uF; Diameter: 10mm
footprint WCAP-ATG8_10x16
pins: 1 N, 2 P

## 860010575014
designator C?, comment 560uF, 35V
WCAP-ATG8 Aluminum Electrolytic Capacitor, Radial, THT, D10xH20mm, 560uF, 35V; Manufacturer Part Number: 860010575014; Manufacturer: Wurth Elektronik; Dissipation Factor: 12%; Endurance: 2000h; Leakage Current: 196uA; Ripple Current: 847mA; Capacitance Tolerance: +/-20%; Rated Voltage: 35VDC; Technical Reference: ATBF200561M035DSPAAB000; ComponentLink1Description: Manufacturer; ComponentLink1URL: http://www.we-online.de; ComponentLink2Description: Datasheet; ComponentLink2URL: https://www.we-online.com/catalog/datasheet/860010575014.pdf; Height: 20mm; Mounting Technology: THT; Operating Temperature: -40 to +85degC; Packaging: Ammo Pack; Published Date: May 2020; Capacitance: 560uF; Diameter: 10mm
footprint WCAP-ATG8_10x20
pins: 1 N, 2 P

## 860010575015
designator C?, comment 680uF, 35V
WCAP-ATG8 Aluminum Electrolytic Capacitor, Radial, THT, D10xH20mm, 680uF, 35V; Manufacturer Part Number: 860010575015; Manufacturer: Wurth Elektronik; Dissipation Factor: 12%; Endurance: 2000h; Leakage Current: 238uA; Ripple Current: 891mA; Capacitance Tolerance: +/-20%; Rated Voltage: 35VDC; Technical Reference: ATBF200681M035DSPAAB000; ComponentLink1Description: Manufacturer; ComponentLink1URL: http://www.we-online.de; ComponentLink2Description: Datasheet; ComponentLink2URL: https://www.we-online.com/catalog/datasheet/860010575015.pdf; Height: 20mm; Mounting Technology: THT; Operating Temperature: -40 to +85degC; Packaging: Ammo Pack; Published Date: May 2020; Capacitance: 680uF; Diameter: 10mm
footprint WCAP-ATG8_10x20
pins: 1 N, 2 P

## 860010578016
designator C?, comment 820uF, 35V
WCAP-ATG8 Aluminum Electrolytic Capacitor, Radial, THT, D13xH20mm, 820uF, 35V; Manufacturer Part Number: 860010578016; Manufacturer: Wurth Elektronik; Dissipation Factor: 12%; Endurance: 2000h; Leakage Current: 287uA; Ripple Current: 1045mA; Capacitance Tolerance: +/-20%; Rated Voltage: 35VDC; Technical Reference: ATBI200821M035DSPACB000; ComponentLink1Description: Manufacturer; ComponentLink1URL: http://www.we-online.de; ComponentLink2Description: Datasheet; ComponentLink2URL: https://www.we-online.com/catalog/datasheet/860010578016.pdf; Height: 20mm; Mounting Technology: THT; Operating Temperature: -40 to +85degC; Packaging: Ammo Pack; Published Date: May 2020; Capacitance: 820uF; Diameter: 13mm
footprint WCAP-ATG8_13x20
pins: 1 N, 2 P

## 860010578017
designator C?, comment 1000uF, 35V
WCAP-ATG8 Aluminum Electrolytic Capacitor, Radial, THT, D13xH20mm, 1000uF, 35V; Manufacturer Part Number: 860010578017; Manufacturer: Wurth Elektronik; Dissipation Factor: 12%; Endurance: 2000h; Leakage Current: 350uA; Ripple Current: 1265mA; Capacitance Tolerance: +/-20%; Rated Voltage: 35VDC; Technical Reference: ATBI200102M035DSPACB000; ComponentLink1Description: Manufacturer; ComponentLink1URL: http://www.we-online.de; ComponentLink2Description: Datasheet; ComponentLink2URL: https://www.we-online.com/catalog/datasheet/860010578017.pdf; Height: 20mm; Mounting Technology: THT; Operating Temperature: -40 to +85degC; Packaging: Ammo Pack; Published Date: May 2020; Capacitance: 1000uF; Diameter: 13mm
footprint WCAP-ATG8_13x20
pins: 1 N, 2 P

## 860010578018
designator C?, comment 1200uF, 35V
WCAP-ATG8 Aluminum Electrolytic Capacitor, Radial, THT, D13xH20mm, 1200uF, 35V; Manufacturer Part Number: 860010578018; Manufacturer: Wurth Elektronik; Dissipation Factor: 12%; Endurance: 2000h; Leakage Current: 420uA; Ripple Current: 1375mA; Capacitance Tolerance: +/-20%; Rated Voltage: 35VDC; Technical Reference: ATBI200122M035DSPACB000; ComponentLink1Description: Manufacturer; ComponentLink1URL: http://www.we-online.de; ComponentLink2Description: Datasheet; ComponentLink2URL: https://www.we-online.com/catalog/datasheet/860010578018.pdf; Height: 20mm; Mounting Technology: THT; Operating Temperature: -40 to +85degC; Packaging: Ammo Pack; Published Date: May 2020; Capacitance: 1200uF; Diameter: 13mm
footprint WCAP-ATG8_13x20
pins: 1 N, 2 P

## 860010578019
designator C?, comment 1500uF, 35V
WCAP-ATG8 Aluminum Electrolytic Capacitor, Radial, THT, D13xH25mm, 1500uF, 35V; Manufacturer Part Number: 860010578019; Manufacturer: Wurth Elektronik; Dissipation Factor: 12%; Endurance: 2000h; Leakage Current: 525uA; Ripple Current: 1570mA; Capacitance Tolerance: +/-20%; Rated Voltage: 35VDC; Technical Reference: ATBI250152M035DSPACB000; ComponentLink1Description: Manufacturer; ComponentLink1URL: http://www.we-online.de; ComponentLink2Description: Datasheet; ComponentLink2URL: https://www.we-online.com/catalog/datasheet/860010578019.pdf; Height: 25mm; Mounting Technology: THT; Operating Temperature: -40 to +85degC; Packaging: Ammo Pack; Published Date: May 2020; Capacitance: 1500uF; Diameter: 13mm
footprint WCAP-ATG8_13x25
pins: 1 N, 2 P

## 860010580020
designator C?, comment 1800uF, 35V
WCAP-ATG8 Aluminum Electrolytic Capacitor, Radial, THT, D16xH25mm, 1800uF, 35V; Manufacturer Part Number: 860010580020; Manufacturer: Wurth Elektronik; Dissipation Factor: 12%; Endurance: 2000h; Leakage Current: 630uA; Ripple Current: 1749mA; Capacitance Tolerance: +/-20%; Rated Voltage: 35VDC; Technical Reference: ATBK250182M035DSPAEB000; ComponentLink1Description: Manufacturer; ComponentLink1URL: http://www.we-online.de; ComponentLink2Description: Datasheet; ComponentLink2URL: https://www.we-online.com/catalog/datasheet/860010580020.pdf; Height: 25mm; Mounting Technology: THT; Operating Temperature: -40 to +85degC; Packaging: Ammo Pack; Published Date: May 2020; Capacitance: 1800uF; Diameter: 16mm
footprint WCAP-ATG8_16x25
pins: 1 N, 2 P

## 860010580021
designator C?, comment 2200uF, 35V
WCAP-ATG8 Aluminum Electrolytic Capacitor, Radial, THT, D16xH25mm, 2200uF, 35V; Manufacturer Part Number: 860010580021; Manufacturer: Wurth Elektronik; Dissipation Factor: 12%; Endurance: 2000h; Leakage Current: 770uA; Ripple Current: 1870mA; Capacitance Tolerance: +/-20%; Rated Voltage: 35VDC; Technical Reference: ATBK250222M035DSPAEB000; ComponentLink1Description: Manufacturer; ComponentLink1URL: http://www.we-online.de; ComponentLink2Description: Datasheet; ComponentLink2URL: https://www.we-online.com/catalog/datasheet/860010580021.pdf; Height: 25mm; Mounting Technology: THT; Operating Temperature: -40 to +85degC; Packaging: Ammo Pack; Published Date: May 2020; Capacitance: 2200uF; Diameter: 16mm
footprint WCAP-ATG8_16x25
pins: 1 N, 2 P